# Altium footprint library Connectors Molex.PcbLib: 105 footprints (part 2 of 7)
Each footprint in its own frame and in the unit in brackets; x right, y up, seen from the top. Pads: shape width x height; smd on the part's side, far side on the other; paste and mask are expansions set on the pad; w line width, h text height; cw(c..) or ccw(c..) is an arc to the next point about the centre after c.
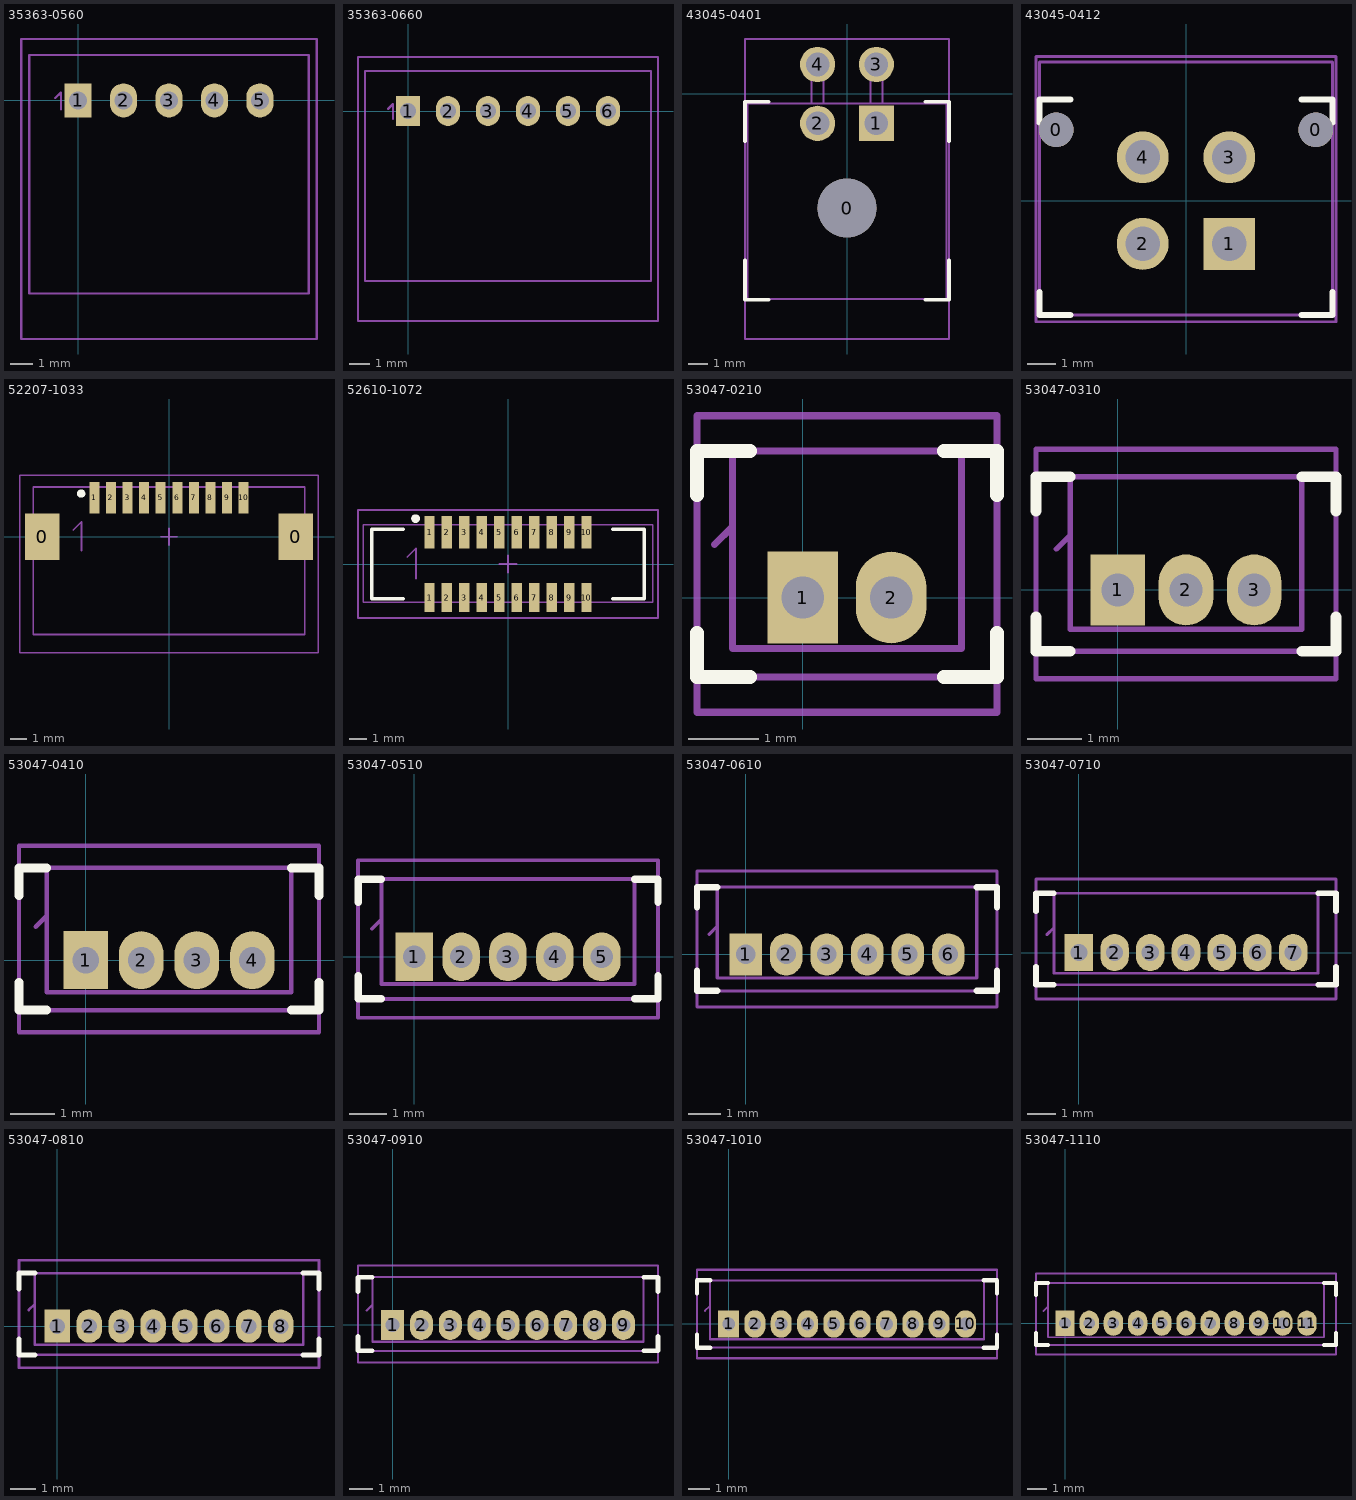
[diagram p1: the footprints below, top view; thin cyan lines are the x and y axes]

## 35363-0560 [mm] "Sherlock™ 35363"
height 5.5
pads (5):
  rect 1.2x1.5 hole 0.8: 1(0,0)
  oval 1.2x1.5 hole 0.8: 2(2,0) 3(4,0) 4(6,0) 5(8,0)
Mechanical 13:
  lines w0.1: -1,0.1 -0.75,0.35 -0.75,-0.4 ; 10.15,2 10.15,-8.5 -2.15,-8.5 -2.15,2 10.15,2 ; 10.15,2 10.15,2
  text ".Designator" at 3,-2.7 h1.5
Mechanical 15:
  lines w0.1: -2.5,-10.5 10.5,-10.5 10.5,2.7 -2.5,2.7 -2.5,-10.5
3D body "353630560.stp": height 5.5, standoff -3.2, extent -2.15,-8.5 10.15,2

## 35363-0660 [mm] "Sherlock™ 35363"
height 5.5
pads (6):
  rect 1.2x1.5 hole 0.8: 1(0,0)
  oval 1.2x1.5 hole 0.8: 2(2,0) 3(4,0) 4(6,0) 5(8,0) 6(10,0)
Mechanical 13:
  lines w0.1: -1,0.1 -0.75,0.35 -0.75,-0.4 ; -2.15,-8.5 12.15,-8.5 12.15,2 -2.15,2 -2.15,-8.5
  text ".Designator" at 3,-2.7 h1.5
Mechanical 15:
  lines w0.1: -2.5,-10.5 -2.5,2.7 12.5,2.7 12.5,-10.5 -2.5,-10.5
3D body "353630660.stp": height 5.5, standoff -3.2, extent -2.15,-8.5 12.15,2

## 43045-0401 [mm] "Micro-Fit 3.0™ 43045"
height 8.8
pads (5):
  round 3 hole 3 unplated: 0(0,-5.82)
  rect 1.8x1.8 hole 1.2: 1(1.5,-1.5)
  round 1.8 hole 1.2: 2(-1.5,-1.5) 3(1.5,1.5) 4(-1.5,1.5)
Top Overlay:
  lines w0.2: -5.2,-8.5 -5.2,-10.5 -4,-10.5 ; -5.2,-2.4 -5.2,-0.4 -4,-0.4 ; 4,-10.5 5.2,-10.5 5.2,-8.5 ; 4,-0.4 5.2,-0.4 5.2,-2.4
Mechanical 13:
  lines w0.1: -1.8,-0.5 -1.8,1.8 -1.2,1.8 -1.2,-0.5 ; 1.2,-0.5 1.2,1.8 1.8,1.8 1.8,-0.5 ; -5.075,-10.45 -5.075,-0.5 5.075,-0.5 5.075,-10.45 -5.075,-10.45
  text "2" at -3.3,-2 h1
  text "1" at 2.6,-2 h1
  text ".Designator" at -1.6,-8.9 h1.5
Mechanical 15:
  lines w0.1: -5.2,-12.5 5.2,-12.5 5.2,2.8 -5.2,2.8 -5.2,-12.5
3D body "430450401.stp": height 8.77, standoff -3.18, extent -5.075,-10.45 5.075,1.79

## 43045-0412 [mm] "Micro-Fit 3.0™ 43045"
height 9.91
pads (6):
  round 1.2 hole 1.2 unplated: 0(-4.5,2.45) 0(4.5,2.45)
  rect 1.8x1.8 hole 1.2: 1(1.5,-1.5)
  round 1.8 hole 1.2: 2(-1.5,-1.5) 3(1.5,1.5) 4(-1.5,1.5)
Top Overlay:
  lines w0.2: -5.075,-3.17 -5.075,-3.97 ; -5.075,2.7 -5.075,3.5 ; -4,-3.97 -5.075,-3.97 ; -4,3.5 -5.075,3.5 ; 4,-3.97 5.075,-3.97 ; 4,3.5 5.075,3.5 ; 5.075,-3.17 5.075,-3.97 ; 5.075,2.7 5.075,3.5 ; -5.075,-3.97 -5.075,-3.97 ; -5.075,3.5 -5.075,3.5 ; 5.075,-3.97 5.075,-3.97 ; 5.075,3.5 5.075,3.5
Mechanical 13:
  lines w0.1: -5.075,-3.97 5.075,-3.97 5.075,4.8 -5.075,4.8 -5.075,-3.97
  text "2" at -3.3,-2 h1
  text "1" at 2.6,-2 h1
  text ".Designator" at -0.7,0 h1.5
Mechanical 15:
  lines w0.1: -5.2,-4.2 5.2,-4.2 5.2,5 -5.2,5 -5.2,-4.2
3D body "430450412.stp": height 9.91, standoff -3.18, extent -5.075,-3.97 5.075,4.8

## 52207-1033 [mm] "Easy-On™ 52207"
height 2.7
pads (12):
  rect 2.1x2.8 smd: 0(-7.65,0) 0(7.65,0)
  rect 0.6x1.9 smd: 1(-4.5,2.35) 2(-3.5,2.35) 3(-2.5,2.35) 4(-1.5,2.35) 5(-0.5,2.35) 6(0.5,2.35) 7(1.5,2.35) 8(2.5,2.35) 9(3.5,2.35) 10(4.5,2.35)
Top Overlay:
  circle w0.25: c-5.3,2.6 r0.125
Mechanical 13:
  lines w0.1: -5.775,0.4 -5.275,0.9 -5.275,-0.85 ; -8.2,-5.9 8.2,-5.9 8.2,3 -8.2,3 -8.2,-5.9
  text ".Designator" at -2.025,-0.35 h1.5
Mechanical 15:
  lines w0.1: -0.5,0 0.5,0 ; 0,-0.5 0,0.5 ; -9,-7 9,-7 9,3.7 -9,3.7 -9,-7
3D body "522071033.stp": height 2.7, standoff 0, extent -8.15,-5.9 8.15,3

## 52610-1072 [mm] "Easy-On™ 52610"
height 5.75
pads (20):
  rect 0.6x1.65 smd: 1(-4.5,-1.925) 2(-3.5,-1.925) 3(-2.5,-1.925) 4(-1.5,-1.925) 5(-0.5,-1.925) 6(0.5,-1.925) 7(1.5,-1.925) 8(2.5,-1.925) 9(3.5,-1.925) 10(4.5,-1.925)
  rect 0.6x1.85 smd: 1(-4.5,1.825) 2(-3.5,1.825) 3(-2.5,1.825) 4(-1.5,1.825) 5(-0.5,1.825) 6(0.5,1.825) 7(1.5,1.825) 8(2.5,1.825) 9(3.5,1.825) 10(4.5,1.825)
Top Overlay:
  circle w0.25: c-5.3,2.6 r0.125
  lines w0.2: -6,-2 -7.8,-2 -7.8,2 -6,2 ; 6,-2 7.8,-2 7.8,2 6,2
Mechanical 13:
  lines w0.1: -5.775,0.4 -5.275,0.9 -5.275,-0.85 ; -8.3,-2.2 8.3,-2.2 8.3,2.25 -8.3,2.25 -8.3,-2.2
  text ".Designator" at -2.025,-0.35 h1.5
Mechanical 15:
  lines w0.1: -0.5,0 0.5,0 ; 0,-0.5 0,0.5 ; -8.6,-3.1 8.6,-3.1 8.6,3.1 -8.6,3.1 -8.6,-3.1
3D body "526101072.stp": height 5.75, standoff 0, extent -8.301,-2.241 8.299,2.259

## 53047-0210 [mm] "PicoBlade™ 53047-0210"
height 4.7
pads (2):
  rect 1x1.3 hole 0.6: 1(0,0)
  oval 1x1.3 hole 0.6: 2(1.25,0)
Top Overlay:
  lines w0.2: -1.5,-0.5 -1.5,-1.125 -0.75,-1.125 ; -1.5,1.45 -1.5,2.075 -0.75,2.075 ; 2,-1.125 2.75,-1.125 2.75,-0.5 ; 2,2.075 2.75,2.075 2.75,1.45
Top Solder:
  rectangle: 0,-0.75 1.25,0.75
Bottom Solder:
  rectangle: 0,-0.75 1.25,0.75
Mechanical 1:
  lines w0.1: -1,-0.725 -1,2.075 2.25,2.075 2.25,-0.725 -1,-0.725
Mechanical 13:
  lines w0.1: -1.25,0.75 -1,1 -1,0.25 ; -1.5,-1.125 -1.5,2.075 2.75,2.075 2.75,-1.125 -1.5,-1.125
  text ".Designator" at -0.875,0.825 h1.5
Mechanical 15:
  lines w0.1: -1.5,-1.625 2.75,-1.625 2.75,2.575 -1.5,2.575 -1.5,-1.625
3D body "530470210.stp": height 4.2, standoff -2.2, extent -1.475,-1.15 2.775,2.05

## 53047-0310 [mm] "PicoBlade™ 53047-0310"
height 4.7
pads (3):
  rect 1x1.3 hole 0.6: 1(0,0)
  oval 1x1.3 hole 0.6: 2(1.25,0) 3(2.5,0)
Top Overlay:
  lines w0.2: -1.5,-0.5 -1.5,-1.125 -0.875,-1.125 ; -1.5,1.45 -1.5,2.075 -0.875,2.075 ; 3.375,-1.125 4,-1.125 4,-0.5 ; 3.375,2.075 4,2.075 4,1.45
Top Solder:
  rectangle: 0,-0.75 2.5,0.75
Bottom Solder:
  rectangle: 0,-0.75 2.5,0.75
Mechanical 1:
  lines w0.1: -0.875,-0.725 3.375,-0.725 3.375,2.075 -0.875,2.075 -0.875,-0.725
Mechanical 13:
  lines w0.1: -1.125,0.75 -0.875,1 -0.875,0.25 ; 4,2.075 -1.5,2.075 -1.5,-1.125 4,-1.125 4,2.075 ; 4,2.075 4,2.075
  text ".Designator" at -0.45,0.925 h1.5
Mechanical 15:
  lines w0.1: -1.5,-1.625 -1.5,2.575 4,2.575 4,-1.625 -1.5,-1.625
3D body "530470310.stp": height 4.2, standoff -2.3, extent -1.5,-1.1 4,2.1

## 53047-0410 [mm] "PicoBlade™ 53047-0410"
height 4.7
pads (4):
  rect 1x1.3 hole 0.6: 1(0,0)
  oval 1x1.3 hole 0.6: 2(1.25,0) 3(2.5,0) 4(3.75,0)
Top Overlay:
  lines w0.2: -1.5,-0.5 -1.5,-1.125 -0.875,-1.125 ; -1.5,1.45 -1.5,2.075 -0.875,2.075 ; 4.625,-1.125 5.25,-1.125 5.25,-0.5 ; 4.625,2.075 5.25,2.075 5.25,1.45
Top Solder:
  rectangle: 0,-0.75 3.75,0.75
Bottom Solder:
  region: 3.75,0.75 0,0.75 0,-0.75 3.75,-0.75
Mechanical 1:
  lines w0.1: -0.875,-0.725 4.625,-0.725 4.625,2.075 -0.875,2.075 -0.875,-0.725
Mechanical 13:
  lines w0.1: -1.125,0.75 -0.875,1 -0.875,0.25 ; 5.25,2.075 -1.5,2.075 -1.5,-1.125 5.25,-1.125 5.25,2.075 ; 5.25,2.075 5.25,2.075
  text ".Designator" at -0.075,0.925 h1.5
Mechanical 15:
  lines w0.1: -1.5,-1.625 -1.5,2.575 5.25,2.575 5.25,-1.625 5.25,-1.625 -1.5,-1.625
3D body "530470410.stp": height 4.2, standoff -2.2, extent -1.5,-1.125 5.25,2.075

## 53047-0510 [mm] "PicoBlade™ 53047-0510"
height 4.7
pads (5):
  rect 1x1.3 hole 0.6: 1(0,0)
  oval 1x1.3 hole 0.6: 2(1.25,0) 3(2.5,0) 4(3.75,0) 5(5,0)
Top Overlay:
  lines w0.2: -1.5,-0.5 -1.5,-1.125 -0.875,-1.125 ; -1.5,1.45 -1.5,2.075 -0.875,2.075 ; 5.875,-1.125 6.5,-1.125 6.5,-0.5 ; 5.875,2.075 6.5,2.075 6.5,1.45
Top Solder:
  rectangle: 0,-0.75 5,0.75
Bottom Solder:
  region: 5,0.75 0,0.75 0,-0.75 5,-0.75
Mechanical 1:
  lines w0.1: -0.875,-0.725 5.875,-0.725 5.875,2.075 -0.875,2.075 -0.875,-0.725
Mechanical 13:
  lines w0.1: -1.125,0.75 -0.875,1 -0.875,0.25 ; 6.5,2.075 -1.5,2.075 -1.5,-1.125 6.5,-1.125 6.5,2.075 ; 6.5,2.075 6.5,2.075
  text ".Designator" at -0.25,0.9 h1.5
Mechanical 15:
  lines w0.1: -1.5,-1.625 -1.5,2.575 6.5,2.575 6.5,-1.625 6.5,-1.625 -1.5,-1.625
3D body "530470510.stp": height 4.2, standoff -2.2, extent -1.5,-1.125 6.5,2.075

## 53047-0610 [mm] "PicoBlade™ 53047-0610"
height 4.7
pads (6):
  rect 1x1.3 hole 0.6: 1(0,0)
  oval 1x1.3 hole 0.6: 2(1.25,0) 3(2.5,0) 4(3.75,0) 5(5,0) 6(6.25,0)
Top Overlay:
  lines w0.2: -1.5,-0.5 -1.5,-1.125 -0.875,-1.125 ; -1.5,1.45 -1.5,2.075 -0.875,2.075 ; 7.125,-1.125 7.75,-1.125 ; 7.125,2.075 7.75,2.075 ; 7.75,-1.125 7.75,-0.5 ; 7.75,1.45 7.75,2.075
Top Solder:
  rectangle: 0,-0.75 6.25,0.75
Bottom Solder:
  region: 6.25,0.75 0,0.75 0,-0.75 6.25,-0.75
Mechanical 1:
  lines w0.1: -0.875,-0.725 7.125,-0.725 7.125,2.075 -0.875,2.075 -0.875,-0.725
Mechanical 13:
  lines w0.1: -1.125,0.625 -0.875,0.875 -0.875,0.125 ; 7.75,-1.125 7.75,2.075 -1.5,2.075 -1.5,-1.125 7.75,-1.125
  text ".Designator" at 1.65,1.025 h1.5
Mechanical 15:
  lines w0.1: -1.5,-1.625 -1.5,2.575 7.75,2.575 7.75,-1.625 -1.5,-1.625
3D body "530470610.stp": height 4.2, standoff -2.3, extent -1.5,-1.125 7.75,2.075

## 53047-0710 [mm] "PicoBlade™ 53047-0710"
height 4.7
pads (7):
  rect 1x1.3 hole 0.6: 1(0,0)
  oval 1x1.3 hole 0.6: 2(1.25,0) 3(2.5,0) 4(3.75,0) 5(5,0) 6(6.25,0) 7(7.5,0)
Top Overlay:
  lines w0.2: -1.5,-0.5 -1.5,-1.125 -0.875,-1.125 ; -1.5,1.45 -1.5,2.075 -0.875,2.075 ; 8.375,-1.125 9,-1.125 9,-0.5 ; 8.375,2.075 9,2.075 9,1.45
Top Solder:
  rectangle: 0,-0.75 7.5,0.75
Bottom Solder:
  region: 7.5,0.75 0,0.75 0,-0.75 7.5,-0.75
Mechanical 1:
  lines w0.1: -0.875,-0.725 -0.875,2.075 8.375,2.075 8.375,-0.725 -0.875,-0.725
Mechanical 13:
  lines w0.1: -1.125,0.625 -0.875,0.875 -0.875,0.125 ; -1.5,-1.125 -1.5,2.075 9,2.075 9,-1.125 -1.5,-1.125
  text ".Designator" at 1.65,1.025 h1.5
Mechanical 15:
  lines w0.1: -1.5,-1.625 9,-1.625 9,2.575 -1.5,2.575 -1.5,-1.625
3D body "530470710.stp": height 4.2, standoff -2.3, extent -1.5,-1.125 9,2.075

## 53047-0810 [mm] "PicoBlade™ 53047-0810"
height 4.7
pads (8):
  rect 1x1.3 hole 0.6: 1(0,0)
  oval 1x1.3 hole 0.6: 2(1.25,0) 3(2.5,0) 4(3.75,0) 5(5,0) 6(6.25,0) 7(7.5,0) 8(8.75,0)
Top Overlay:
  lines w0.2: -1.5,-0.5 -1.5,-1.125 -0.875,-1.125 ; -1.5,1.45 -1.5,2.075 -0.875,2.075 ; 9.625,-1.125 10.25,-1.125 10.25,-0.5 ; 9.625,2.075 10.25,2.075 10.25,1.45
Top Solder:
  rectangle: 0,-0.75 8.75,0.75
Bottom Solder:
  region: 8.75,0.75 0,0.75 0,-0.75 8.75,-0.75
Mechanical 1:
  lines w0.1: -0.875,-0.725 9.625,-0.725 9.625,2.075 -0.875,2.075 -0.875,-0.725
Mechanical 13:
  lines w0.1: -1.125,0.625 -0.875,0.875 -0.875,0.125 ; 10.25,2.075 -1.5,2.075 -1.5,-1.125 10.25,-1.125 10.25,2.075 ; 10.25,2.075 10.25,2.075
  text ".Designator" at 2.125,0.85 h1.5
Mechanical 15:
  lines w0.1: -1.5,-1.625 -1.5,2.575 10.25,2.575 10.25,-1.625 10.25,-1.625 -1.5,-1.625
3D body "530470810.stp": height 4.2, standoff -2.2, extent -1.5,-1.15 10.25,2.05

## 53047-0910 [mm] "PicoBlade™ 53047-0910"
height 4.7
pads (9):
  rect 1x1.3 hole 0.6: 1(0,0)
  oval 1x1.3 hole 0.6: 2(1.25,0) 3(2.5,0) 4(3.75,0) 5(5,0) 6(6.25,0) 7(7.5,0) 8(8.75,0) 9(10,0)
Top Overlay:
  lines w0.2: -1.5,-0.5 -1.5,-1.125 -0.875,-1.125 ; -1.5,1.45 -1.5,2.075 -0.875,2.075 ; 10.875,-1.125 11.5,-1.125 11.5,-0.5 ; 10.875,2.075 11.5,2.075 11.5,1.45
Top Solder:
  rectangle: 0,-0.75 10,0.75
Bottom Solder:
  region: 10,0.75 0,0.75 0,-0.75 10,-0.75
Mechanical 1:
  lines w0.1: -0.875,-0.725 10.875,-0.725 10.875,2.075 -0.875,2.075 -0.875,-0.725
Mechanical 13:
  lines w0.1: -1.125,0.625 -0.875,0.875 -0.875,0.125 ; 11.5,2.075 11.5,-1.125 -1.5,-1.125 -1.5,2.075 11.5,2.075 ; 11.5,2.075 11.5,2.075
  text ".Designator" at 3.05,0.975 h1.5
Mechanical 15:
  lines w0.1: 11.5,-1.625 -1.5,-1.625 -1.5,2.575 11.5,2.575 11.5,-1.625
3D body "530470910.stp": height 4.2, standoff -2.3, extent -1.5,-1.1 11.5,2.1

## 53047-1010 [mm] "PicoBlade™ 53047-1010"
height 4.7
pads (10):
  rect 1x1.3 hole 0.6: 1(0,0)
  oval 1x1.3 hole 0.6: 2(1.25,0) 3(2.5,0) 4(3.75,0) 5(5,0) 6(6.25,0) 7(7.5,0) 8(8.75,0) 9(10,0) 10(11.25,0)
Top Overlay:
  lines w0.2: -1.5,-0.5 -1.5,-1.125 -0.875,-1.125 ; -1.5,1.45 -1.5,2.075 -0.875,2.075 ; 12.125,-1.125 12.75,-1.125 12.75,-0.5 ; 12.125,2.075 12.75,2.075 ; 12.75,1.45 12.75,2.075
Top Solder:
  rectangle: 0,-0.75 11.25,0.75
Bottom Solder:
  region: 11.25,0.75 0,0.75 0,-0.75 11.25,-0.75
Mechanical 1:
  lines w0.1: -0.875,-0.725 -0.875,2.075 12.125,2.075 12.125,-0.725 -0.875,-0.725
Mechanical 13:
  lines w0.1: -1.125,0.625 -0.875,0.875 -0.875,0.125 ; 12.75,-1.125 12.75,2.075 ; 12.75,-1.125 -1.5,-1.125 -1.5,2.075 12.75,2.075 ; 12.75,2.075 12.75,2.075
  text ".Designator" at 3.525,0.975 h1.5
Mechanical 15:
  lines w0.1: -1.5,-1.625 12.75,-1.625 12.75,2.575 -1.5,2.575 -1.5,-1.625
3D body "530471010.stp": height 4.2, standoff -2.3, extent -1.5,-1.125 12.75,2.075

## 53047-1110 [mm] "PicoBlade™ 53047-1110"
height 4.7
pads (11):
  rect 1x1.3 hole 0.6: 1(0,0)
  oval 1x1.3 hole 0.6: 2(1.25,0) 3(2.5,0) 4(3.75,0) 5(5,0) 6(6.25,0) 7(7.5,0) 8(8.75,0) 9(10,0) 10(11.25,0) 11(12.5,0)
Top Overlay:
  lines w0.2: -1.5,-0.5 -1.5,-1.125 -0.875,-1.125 ; -1.5,1.45 -1.5,2.075 -0.875,2.075 ; 13.375,-1.125 14,-1.125 14,-0.5 ; 13.375,2.075 14,2.075 14,1.45
Top Solder:
  rectangle: 0,-0.75 12.5,0.75
Bottom Solder:
  region: 12.5,0.75 0,0.75 0,-0.75 12.5,-0.75
Mechanical 1:
  lines w0.1: -0.875,-0.725 13.375,-0.725 13.375,2.075 -0.875,2.075 -0.875,-0.725
Mechanical 13:
  lines w0.1: -1.125,0.625 -0.875,0.875 -0.875,0.125 ; -1.5,-1.125 14,-1.125 14,2.075 -1.5,2.075 -1.5,-1.125
  text ".Designator" at 4.25,1.05 h1.5
Mechanical 15:
  lines w0.1: -1.5,-1.625 -1.5,2.575 14,2.575 14,-1.625 -1.5,-1.625
3D body "530471110.stp": height 4.2, standoff -2.3, extent -1.5,-1.125 14,2.075